# Altium footprint library Chickenfood.PcbLib: 40 footprints (part 2 of 3)
Each footprint in its own frame and in the unit in brackets; x right, y up, seen from the top. Pads: shape width x height; smd on the part's side, far side on the other; paste and mask are expansions set on the pad; w line width, h text height; cw(c..) or ccw(c..) is an arc to the next point about the centre after c.
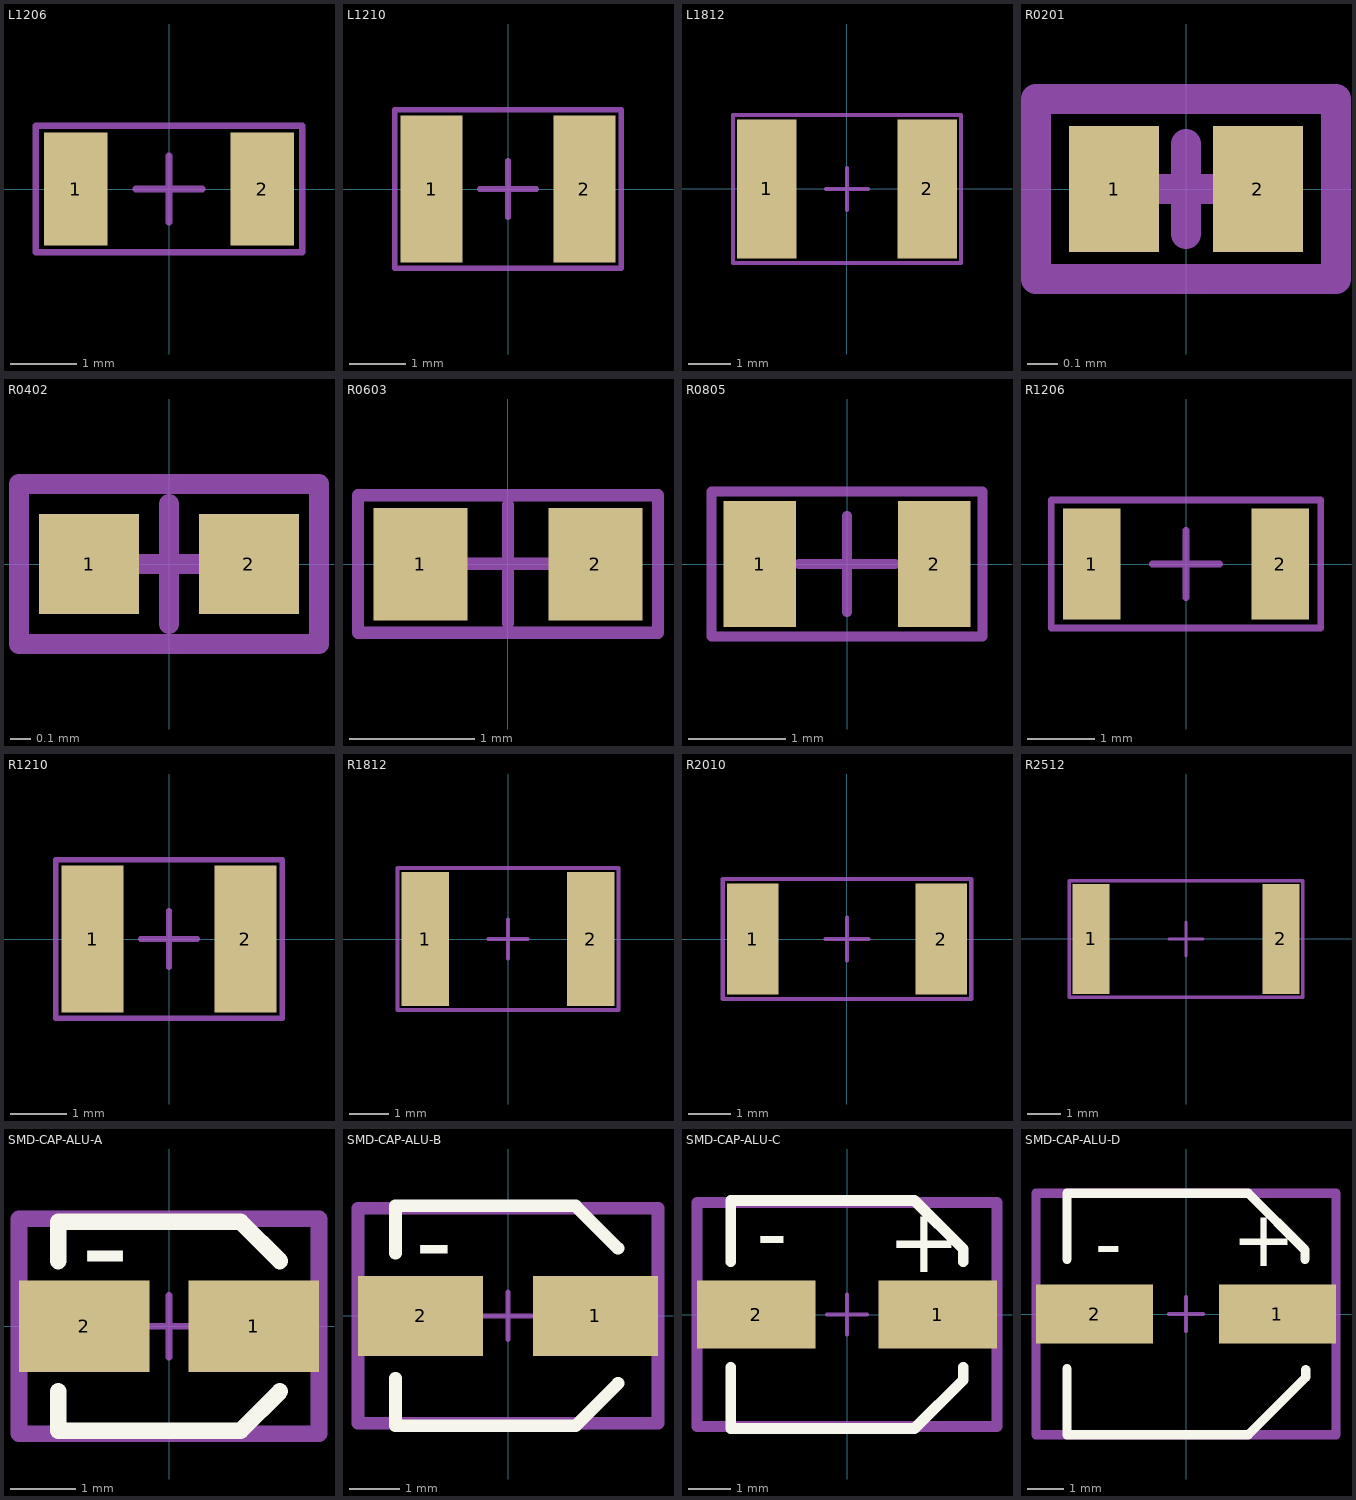
[diagram p1: the footprints below, top view; thin cyan lines are the x and y axes]

## L1206 [mm]
height 1.35
pads (2):
  rect 0.95x1.7 smd: 1(-1.4,0) 2(1.4,0)
Top Courtyard:
  lines w0.1: -2,-0.95 2,-0.95 2,0.95 -2,0.95 -2,-0.95
Top Designator:
  text ".Designator" at -2.026,-0.204 h0.9
Top Component Center (Mech17):
  lines w0.1: -0.5,0 0.5,0 ; 0,-0.5 0,0.5
3D body "L1206.STEP": height 0.6, standoff 0, extent -1.6,-0.8 1.6,0.8

## L1210 [mm] "Inductor, Body 3.2x2.5mm (LxW typ)"
pads (2):
  rect 1.1x2.6 smd: 1(-1.35,0) 2(1.35,0)
Top Courtyard:
  lines w0.1: -2,-1.4 2,-1.4 2,1.4 -2,1.4 -2,-1.4
Top Designator:
  text ".Designator" at -2.026,-0.204 h0.9
Top Component Center (Mech17):
  lines w0.1: -0.5,0 0.5,0 ; 0,-0.5 0,0.5
3D body "L1210.STEP": height 0.6, standoff 0, extent -1.6,-1.25 1.6,1.25

## L1812 [mm] "Chip Capacitor; Body 4.5x3.2mm (LxW typ), IPC High Density"
height 1.35
pads (2):
  rect 1.4x3.3 smd: 1(-1.9,0) 2(1.9,0)
Top Courtyard:
  lines w0.1: -2.7,-1.75 2.7,-1.75 2.7,1.75 -2.7,1.75 -2.7,-1.75
Top Designator:
  text ".Designator" at -2.699,-0.272 h1.2
Top Component Center (Mech17):
  lines w0.1: -0.5,0 0.5,0 ; 0,-0.5 0,0.5
3D body "L1812.STEP": height 0.6, standoff 0, extent -2.25,-1.6 2.25,1.6

## R0201 [mm] "Chip Resistor, Body 0.6x0.3mm (LxW typ), IPC High Density"
height 0.6
pads (2):
  rect 0.3x0.42 smd: 1(-0.24,0) 2(0.24,0)
Top Courtyard:
  lines w0.1: -0.5,-0.3 0.5,-0.3 0.5,0.3 -0.5,0.3 -0.5,-0.3
Top Designator:
  text ".Designator" at -0.451,-0.045 h0.2
Top Component Center (Mech17):
  lines w0.1: -0.15,0 0.15,0 ; 0,-0.15 0,0.15
3D body "R0201.STEP": height 0.23, standoff 0, extent -0.3,-0.15 0.3,0.15

## R0402 [mm] "Chip Resistor, Body 1.1x0.5mm (LxW typ), IPC High Density"
height 0.4
pads (2):
  rect 0.5x0.5 smd: 1(-0.4,0) 2(0.4,0)
Top Courtyard:
  lines w0.1: -0.75,-0.4 0.75,-0.4 0.75,0.4 -0.75,0.4 -0.75,-0.4
Top Designator:
  text ".Designator" at -0.564,-0.057 h0.25
Top Component Center (Mech17):
  lines w0.1: -0.3,0 0.3,0 ; 0,-0.3 0,0.3
3D body "R0402.STEP": height 0.35, standoff 0, extent -0.5,-0.25 0.5,0.25

## R0603 [mm] "Chip Resistor, Body 1.6x0.8mm (LxW typ), IPC High Density"
height 0.6
pads (2):
  rect 0.75x0.9 smd: 1(-0.7,0) 2(0.7,0)
Top Courtyard:
  lines w0.1: -1.2,-0.55 -1.2,0.55 1.2,0.55 1.2,-0.55 -1.2,-0.55
Top Designator:
  text ".Designator" at -1.126,-0.113 h0.5
Top Component Center (Mech17):
  lines w0.1: -0.475,0 0.475,0 ; 0,-0.475 0,0.475
3D body "R0603.STEP": height 0.45, standoff 0, extent -0.8,-0.4 0.8,0.4

## R0805 [mm] "Chip Resistor, Body 2.0x1.3mm (LxW typ), IPC High Density"
height 0.65
pads (2):
  rect 0.75x1.3 smd: 1(-0.9,0) 2(0.9,0)
Top Courtyard:
  lines w0.1: -1.4,-0.75 -1.4,0.75 1.4,0.75 1.4,-0.75 -1.4,-0.75
Top Designator:
  text ".Designator" at -1.346,-0.135 h0.6
Top Component Center (Mech17):
  lines w0.1: -0.5,0 0.5,0 ; 0,-0.5 0,0.5
3D body "R0805.STEP": height 0.6, standoff 0, extent -1,-0.625 1,0.625

## R1206 [mm] "Chip Resistor, Body 3.2x1.6mm (LxW typ), IPC High Density"
height 0.71
pads (2):
  rect 0.85x1.65 smd: 1(-1.4,0) 2(1.4,0)
Top Courtyard:
  lines w0.1: -2,-0.95 2,-0.95 2,0.95 -2,0.95 -2,-0.95
Top Designator:
  text ".Designator" at -1.909,-0.192 h0.85
Top Component Center (Mech17):
  lines w0.1: -0.5,0 0.5,0 ; 0,-0.5 0,0.5
3D body "R1206.STEP": height 0.6, standoff 0, extent -1.6,-0.8 1.6,0.8

## R1210 [mm] "Chip Resistor, Body 3.2x2.5mm (LxW typ), IPC High Density"
height 0.71
pads (2):
  rect 1.1x2.6 smd: 1(-1.35,0) 2(1.35,0)
Top Courtyard:
  lines w0.1: -2,-1.4 -2,1.4 2,1.4 2,-1.4 -2,-1.4
Top Designator:
  text ".Designator" at -2.026,-0.204 h0.9
Top Component Center (Mech17):
  lines w0.1: -0.5,0 0.5,0 ; 0,-0.5 0,0.5
3D body "R1210.STEP": height 0.6, standoff 0, extent -1.6,-1.25 1.6,1.25

## R1812 [mm] "Chip Resistor, Body 4.5x3.2mm (LxW typ), IPC High Density"
pads (2):
  rect 1.2x3.4 smd: 1(-2.1,0) 2(2.1,0)
Top Courtyard:
  lines w0.1: -2.8,-1.8 2.8,-1.8 2.8,1.8 -2.8,1.8 -2.8,-1.8
Top Designator:
  text ".Designator" at -2.473,-0.249 h1.1
Top Component Center (Mech17):
  lines w0.1: -0.5,0 0.5,0 ; 0,-0.5 0,0.5
3D body "R1812.STEP": height 0.6, standoff 0, extent -2.25,-1.6 2.25,1.6

## R2010 [mm] "Chip Resistor, Body 5.0x2.5mm (LxW typ), IPC High Density"
height 0.71
pads (2):
  rect 1.2x2.6 smd: 1(-2.2,0) 2(2.2,0)
Top Courtyard:
  lines w0.1: -2.9,-1.4 -2.9,1.4 2.9,1.4 2.9,-1.4 -2.9,-1.4
Top Designator:
  text ".Designator" at -2.816,-0.283 h1.25
Top Component Center (Mech17):
  lines w0.1: -0.5,0 0.5,0 ; 0,-0.5 0,0.5
3D body "R2010.STEP": height 0.6, standoff 0, extent -2.5,-1.25 2.5,1.25

## R2512 [mm] "Chip Resistor, Body 6.3x3.2mm (LxW typ), IPC High Density"
height 0.71
pads (2):
  rect 1.1x3.3 smd: 1(-2.85,0) 2(2.85,0)
Top Courtyard:
  lines w0.1: -3.5,-1.75 -3.5,1.75 3.5,1.75 3.5,-1.75 -3.5,-1.75
Top Designator:
  text ".Designator" at -3.379,-0.34 h1.5
Top Component Center (Mech17):
  lines w0.1: -0.5,0 0.5,0 ; 0,-0.5 0,0.5
3D body "R2512.STEP": height 0.6, standoff 0, extent -3.2,-1.6 3.2,1.6

## SMD-CAP-ALU-A [mm] "Ø3.0mm x 5.4mm"
pads (2):
  rect 2x1.4 smd: 1(1.3,0) 2(-1.3,0)
Top Overlay:
  lines w0.254: -1.7,-1 -1.7,-1.6 1.1,-1.6 1.7,-1 ; -1.7,1 -1.7,1.6 1.1,1.6 1.7,1
  text "-" at -1.35,0.5 h1.52
Top Courtyard:
  lines w0.254: -2.3,-1.65 -2.3,1.65 2.3,1.65 2.3,-1.65 -2.3,-1.65
Top Designator:
  text ".Designator" at -2.026,-0.204 h0.9
Top Component Center (Mech17):
  lines w0.1: -0.475,0 0.475,0 ; 0,-0.475 0,0.475
3D body "SMD-CAP-ALU-A.STEP": height 5.4, standoff 0, extent -1.8,-1.65 1.8,1.65

## SMD-CAP-ALU-B [mm] "Ø4.0mm x 5.4mm"
pads (2):
  rect 2.5x1.6 smd: 1(1.75,0) 2(-1.75,0)
Top Overlay:
  lines w0.254: -2.25,-1.25 -2.25,-2.2 1.35,-2.2 2.2,-1.35 ; -2.25,1.25 -2.25,2.2 1.35,2.2 2.2,1.35
  text "-" at -1.85,0.75 h1.52
Top Courtyard:
  lines w0.254: -3,-2.15 3,-2.15 3,2.15 -3,2.15 -3,-2.15
Top Designator:
  text ".Designator" at -2.253,-0.227 h1
Top Component Center (Mech17):
  lines w0.1: -0.475,0 0.475,0 ; 0,-0.475 0,0.475
3D body "SMD-CAP-ALU-B.STEP": height 5.4, standoff 0, extent -2.3,-2.15 2.3,2.15

## SMD-CAP-ALU-C [mm] "Ø5.0mm x 5.4mm"
pads (2):
  rect 2.8x1.6 smd: 1(2.15,0) 2(-2.15,0)
Top Overlay:
  lines w0.254: -2.75,-1.25 -2.75,-2.7 1.6,-2.7 2.75,-1.55 2.75,-1.25 ; -2.75,1.25 -2.75,2.7 1.6,2.7 2.75,1.55 2.75,1.25
  text "+" at 0.95,1 h1.52
  text "-" at -2.15,1.2 h1.52
Top Courtyard:
  lines w0.254: -3.55,-2.65 3.55,-2.65 3.55,2.65 -2.15,2.65 -3.55,2.65 -3.55,-2.65
Top Designator:
  text ".Designator" at -3.379,-0.34 h1.5
Top Component Center (Mech17):
  lines w0.1: -0.475,0 0.475,0 ; 0,-0.475 0,0.475
3D body "SMD-CAP-ALU-C.STEP": height 5.41, standoff 0, extent -2.95,-2.65 2.95,2.65

## SMD-CAP-ALU-D [mm] "Ø6.3mm x 5.4mm"
pads (2):
  rect 3.2x1.6 smd: 1(2.5,0) 2(-2.5,0)
Top Overlay:
  lines w0.254: -3.25,-1.5 -3.25,-3.3 1.7,-3.3 3.275,-1.725 3.275,-1.525 ; -3.25,1.5 -3.25,3.3 1.7,3.3 3.25,1.75 3.25,1.5
  text "+" at 1.25,1.3 h1.52
  text "-" at -2.5,1.2 h1.52
Top Courtyard:
  lines w0.254: -4.1,-3.3 -4.1,3.3 -1.2,3.3 4.1,3.3 4.1,-3.3 -4.1,-3.3
Top Designator:
  text ".Designator" at -3.599,-0.362 h1.6
Top Component Center (Mech17):
  lines w0.1: -0.475,0 0.475,0 ; 0,-0.475 0,0.475
3D body "SMD-CAP-ALU-D.STEP": height 5.4, standoff 0, extent -3.5,-3.3 3.5,3.3